# Altium footprint library BBC_Footprints.PcbLib: 171 footprints (part 2 of 11)
Each footprint in its own frame and in the unit in brackets; x right, y up, seen from the top. Pads: shape width x height; smd on the part's side, far side on the other; paste and mask are expansions set on the pad; w line width, h text height; cw(c..) or ccw(c..) is an arc to the next point about the centre after c.
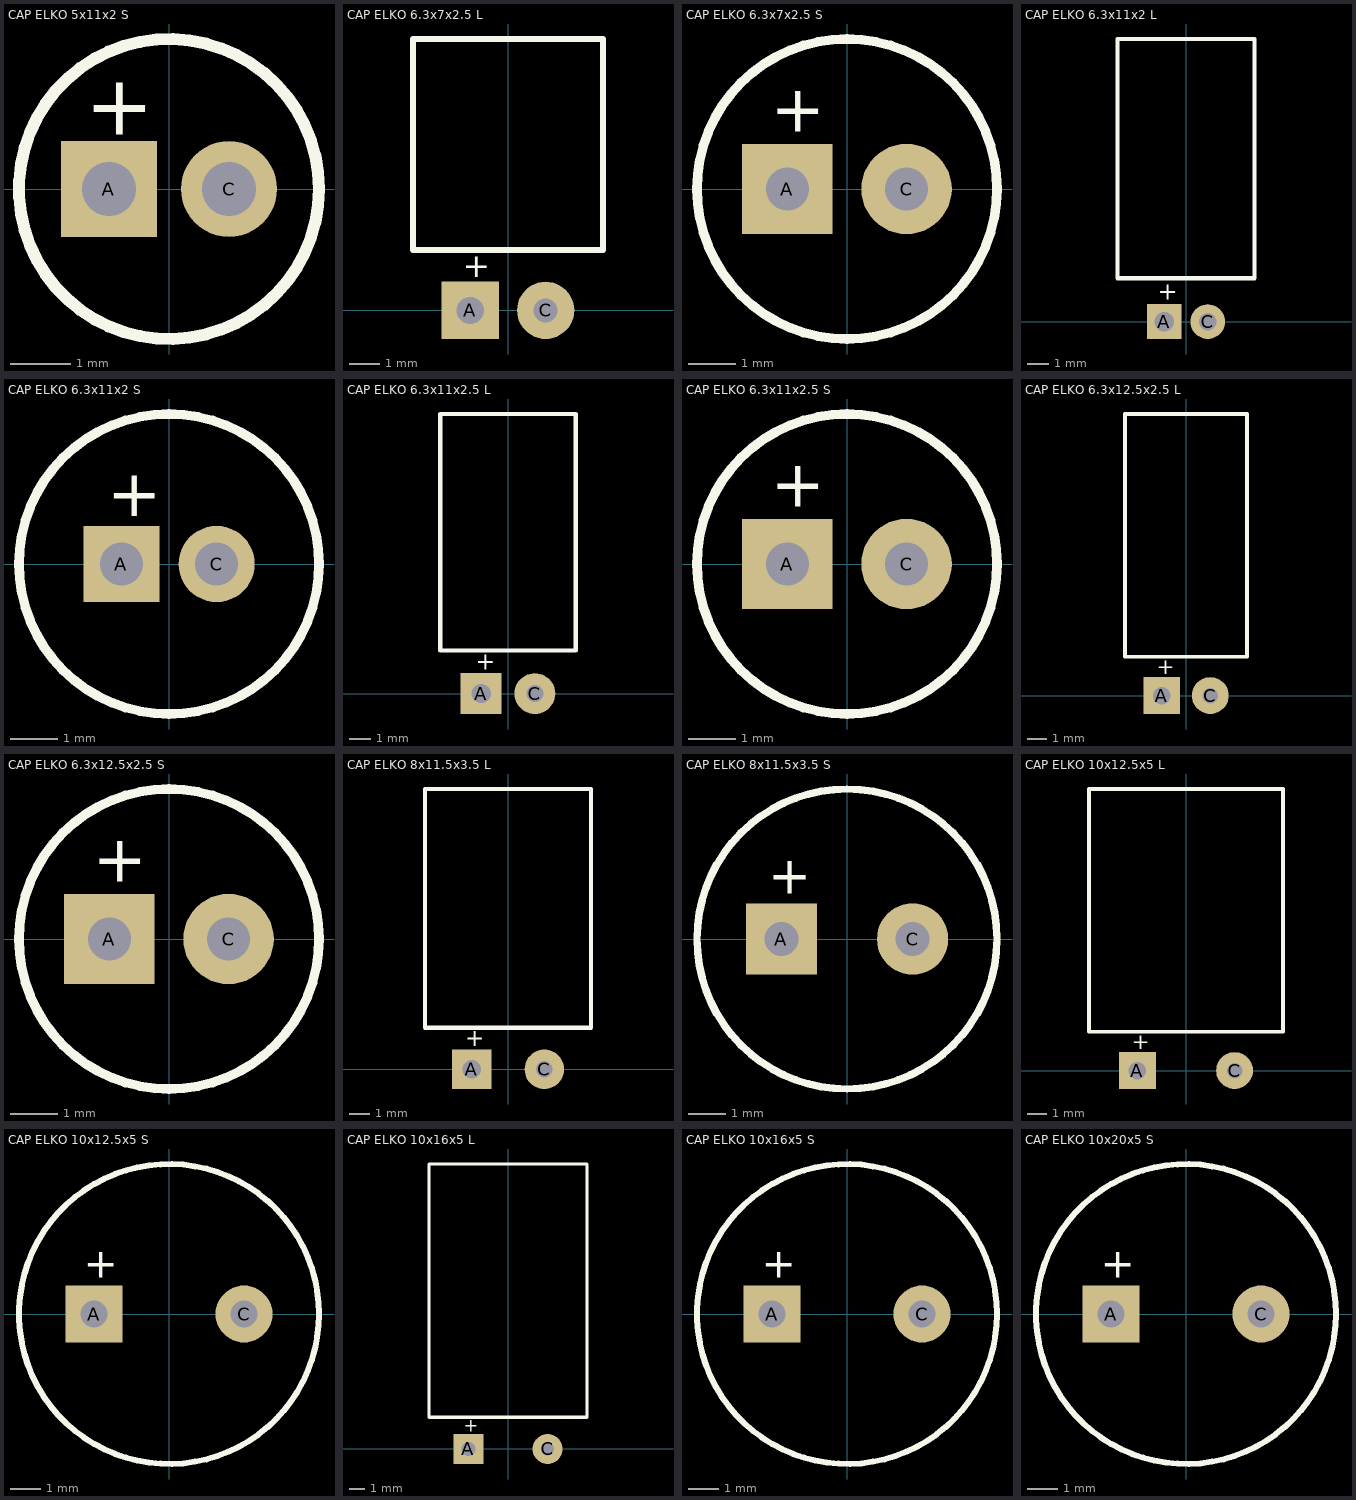
[diagram p1: the footprints below, top view; thin cyan lines are the x and y axes]

## CAP ELKO 5x11x2 S [mm] "aluminium electrolytic capacitor standing upright on the pcb / d=5, h=11, pitch = 2"
height 11
pads (2):
  rect 1.6x1.6 hole 0.9: A(-1,0)
  round 1.6 hole 0.9: C(1,0)
Top Overlay:
  circle w0.2: c0,0 r2.5
  text "+" at -1.4,0.9 h1
3D body "CAP ELKO 5x11x2 S.step": height 11.53, standoff -3.27, extent -2.525,-2.525 2.526,2.525

## CAP ELKO 6.3x7x2.5 L [mm] "aluminium electrolytic capacitor lying on the pcb / d=6.3, h=7, pitch = 2.5"
height 6.3
pads (2):
  rect 1.9x1.9 hole 0.9: A(-1.25,0)
  round 1.9 hole 0.8: C(1.25,0)
Top Overlay:
  lines w0.2: -3.15,2 3.15,2 3.15,9 -3.15,9 -3.15,2
  text "+" at -1.5,1.1 h0.8
3D body "CAP ELKO 6.3x7x2.5 L.step": height 6.33, standoff -2.85, extent -3.175,-0.295 3.176,9.025

## CAP ELKO 6.3x7x2.5 S [mm] "aluminium electrolytic capacitor standing upright on the pcb / d=6.3, h=7, pitch = 2.5"
height 7
pads (2):
  rect 1.9x1.9 hole 0.9: A(-1.25,0)
  round 1.9 hole 0.9: C(1.25,0)
Top Overlay:
  circle w0.2: c0,0 r3.15
  text "+" at -1.6,1.2 h1
3D body "CAP ELKO 6.3x7x2.5 S.step": height 7.53, standoff -3.01, extent -3.175,-3.175 3.176,3.175

## CAP ELKO 6.3x11x2 L [mm] "aluminium electrolytic capacitor lying on the pcb / d=6.3, h=11, pitch = 2"
height 6.3
pads (2):
  rect 1.6x1.6 hole 0.9: A(-1,0)
  round 1.6 hole 0.8: C(1,0)
Top Overlay:
  lines w0.2: -3.15,2 -3.15,13 3.15,13 3.15,2 -3.15,2
  text "+" at -1.3,1 h0.8
3D body "CAP ELKO 6.3x11x2 L.step": height 6.33, standoff -2.85, extent -3.175,-0.295 3.176,13.026

## CAP ELKO 6.3x11x2 S [mm] "aluminium electrolytic capacitor standing upright on the pcb / d=6.3, h=11, pitch = 2"
height 11
pads (2):
  rect 1.6x1.6 hole 0.9: A(-1,0)
  round 1.6 hole 0.9: C(1,0)
Top Overlay:
  circle w0.2: c0,0 r3.15
  text "+" at -1.3,1 h1
3D body "CAP ELKO 6.3x11x2 S.step": height 11.53, standoff -3.27, extent -3.175,-3.175 3.176,3.175

## CAP ELKO 6.3x11x2.5 L [mm] "aluminium electrolytic capacitor lying on the pcb / d=6.3, h=11, pitch = 2.5"
height 6.3
pads (2):
  rect 1.9x1.9 hole 0.9: A(-1.25,0)
  round 1.9 hole 0.8: C(1.25,0)
Top Overlay:
  lines w0.2: -3.15,2 -3.15,13 3.15,13 3.15,2 -3.15,2
  text "+" at -1.5,1.1 h0.8
3D body "CAP ELKO 6.3x11x2.5 L.step": height 6.33, standoff -2.85, extent -3.175,-0.295 3.176,13.026

## CAP ELKO 6.3x11x2.5 S [mm] "aluminium electrolytic capacitor standing upright on the pcb / d=6.3, h=11, pitch = 2.5"
height 11
pads (2):
  rect 1.9x1.9 hole 0.9: A(-1.25,0)
  round 1.9 hole 0.9: C(1.25,0)
Top Overlay:
  circle w0.2: c0,0 r3.15
  text "+" at -1.6,1.2 h1
3D body "CAP ELKO 6.3x11x2.5 S.step": height 11.53, standoff -3.01, extent -3.175,-3.175 3.176,3.175

## CAP ELKO 6.3x12.5x2.5 L [mm] "aluminium electrolytic capacitor lying on the pcb / d=6.3, h=12.5, pitch = 2.5"
height 6.3
pads (2):
  rect 1.9x1.9 hole 0.9: A(-1.25,0)
  round 1.9 hole 0.8: C(1.25,0)
Top Overlay:
  lines w0.2: -3.15,2 3.15,2 3.15,14.5 -3.15,14.5 -3.15,2
  text "+" at -1.5,1.1 h0.8
3D body "CAP ELKO 6.3x12.5x2.5 L.step": height 6.33, standoff -2.85, extent -3.175,-0.295 3.176,14.525

## CAP ELKO 6.3x12.5x2.5 S [mm] "aluminium electrolytic capacitor standing upright on the pcb / d=6.3, h=12.5, pitch = 2.5"
height 12.5
pads (2):
  rect 1.9x1.9 hole 0.9: A(-1.25,0)
  round 1.9 hole 0.9: C(1.25,0)
Top Overlay:
  circle w0.2: c0,0 r3.15
  text "+" at -1.6,1.2 h1
3D body "CAP ELKO 6.3x12.5x2.5 S.step": height 13.03, standoff -3.01, extent -3.175,-3.175 3.175,3.175

## CAP ELKO 8x11.5x3.5 L [mm] "aluminium electrolytic capacitor lying on the pcb / d=8, h=11.5, pitch = 3.5"
height 8
pads (2):
  rect 1.9x1.9 hole 0.9: A(-1.75,0)
  round 1.9 hole 0.8: C(1.75,0)
Top Overlay:
  lines w0.2: -4,2 4,2 4,13.5 -4,13.5 -4,2
  text "+" at -2.05,1.1 h0.8
3D body "CAP ELKO 8x11.5x3.5 L.step": height 8.03, standoff -2, extent -4.025,-0.295 4.026,13.525

## CAP ELKO 8x11.5x3.5 S [mm] "aluminium electrolytic capacitor standing upright on the pcb / d=8, h=11.5, pitch = 3.5"
height 11.5
pads (2):
  rect 1.9x1.9 hole 0.9: A(-1.75,0)
  round 1.9 hole 0.9: C(1.75,0)
Top Overlay:
  circle w0.2: c0,0 r4
  text "+" at -2.1,1.2 h1
3D body "CAP ELKO 8x11.5x3.5 S.step": height 12.03, standoff -3.48, extent -4.025,-4.025 4.025,4.025

## CAP ELKO 10x12.5x5 L [mm] "aluminium electrolytic capacitor lying on the pcb / d=10, h=12.5, pitch = 5"
height 10
pads (2):
  rect 1.9x1.9 hole 0.9: A(-2.5,0)
  round 1.9 hole 0.8: C(2.5,0)
Top Overlay:
  lines w0.2: -5,2 5,2 5,14.5 -5,14.5 -5,2
  text "+" at -2.8,1.1 h0.8
3D body "CAP ELKO 10x12.5x5 L.step": height 10.03, standoff -3.68, extent -5.025,-0.263 5.026,14.225

## CAP ELKO 10x12.5x5 S [mm] "aluminium electrolytic capacitor standing upright on the pcb / d=10, h=12.5, pitch = 5"
height 12.5
pads (2):
  rect 1.9x1.9 hole 0.9: A(-2.5,0)
  round 1.9 hole 0.9: C(2.5,0)
Top Overlay:
  circle w0.2: c0,0 r5
  text "+" at -2.85,1.2 h1
3D body "CAP ELKO 10x12.5x5 S.step": height 13.03, standoff -3.48, extent -5.025,-5.025 5.026,5.025

## CAP ELKO 10x16x5 L [mm] "aluminium electrolytic capacitor lying on the pcb / d=10, h=16, pitch = 5"
height 10
pads (2):
  rect 1.9x1.9 hole 0.9: A(-2.5,0)
  round 1.9 hole 0.8: C(2.5,0)
Top Overlay:
  lines w0.2: -5,2 -5,18 5,18 5,2 -5,2
  text "+" at -2.8,1.1 h0.8
3D body "CAP ELKO 10x16x5 L.step": height 10.03, standoff -3.68, extent -5.025,-0.263 5.025,17.725

## CAP ELKO 10x16x5 S [mm] "aluminium electrolytic capacitor standing upright on the pcb / d=10, h=16, pitch = 5"
height 16
pads (2):
  rect 1.9x1.9 hole 0.9: A(-2.5,0)
  round 1.9 hole 0.9: C(2.5,0)
Top Overlay:
  circle w0.2: c0,0 r5
  text "+" at -2.85,1.2 h1
3D body "CAP ELKO 10x16x5 S.step": height 16.53, standoff -3.74, extent -5.025,-5.025 5.025,5.025

## CAP ELKO 10x20x5 S [mm] "aluminium electrolytic capacitor standing upright on the pcb / d=10, h=20, pitch = 5"
height 20
pads (2):
  rect 1.9x1.9 hole 0.9: A(-2.5,0)
  round 1.9 hole 0.9: C(2.5,0)
Top Overlay:
  circle w0.2: c0,0 r5
  text "+" at -2.85,1.2 h1
3D body "CAP ELKO 10x20x5 S.STEP": height 20.01, standoff -3, extent -5,-5 5.01,5